# Altium footprint library Dahlia Carrier Board.PcbLib: 99 footprints (part 1 of 7)
Each footprint in its own frame and in the unit in brackets; x right, y up, seen from the top. Pads: shape width x height; smd on the part's side, far side on the other; paste and mask are expansions set on the pad; w line width, h text height; cw(c..) or ccw(c..) is an arc to the next point about the centre after c.
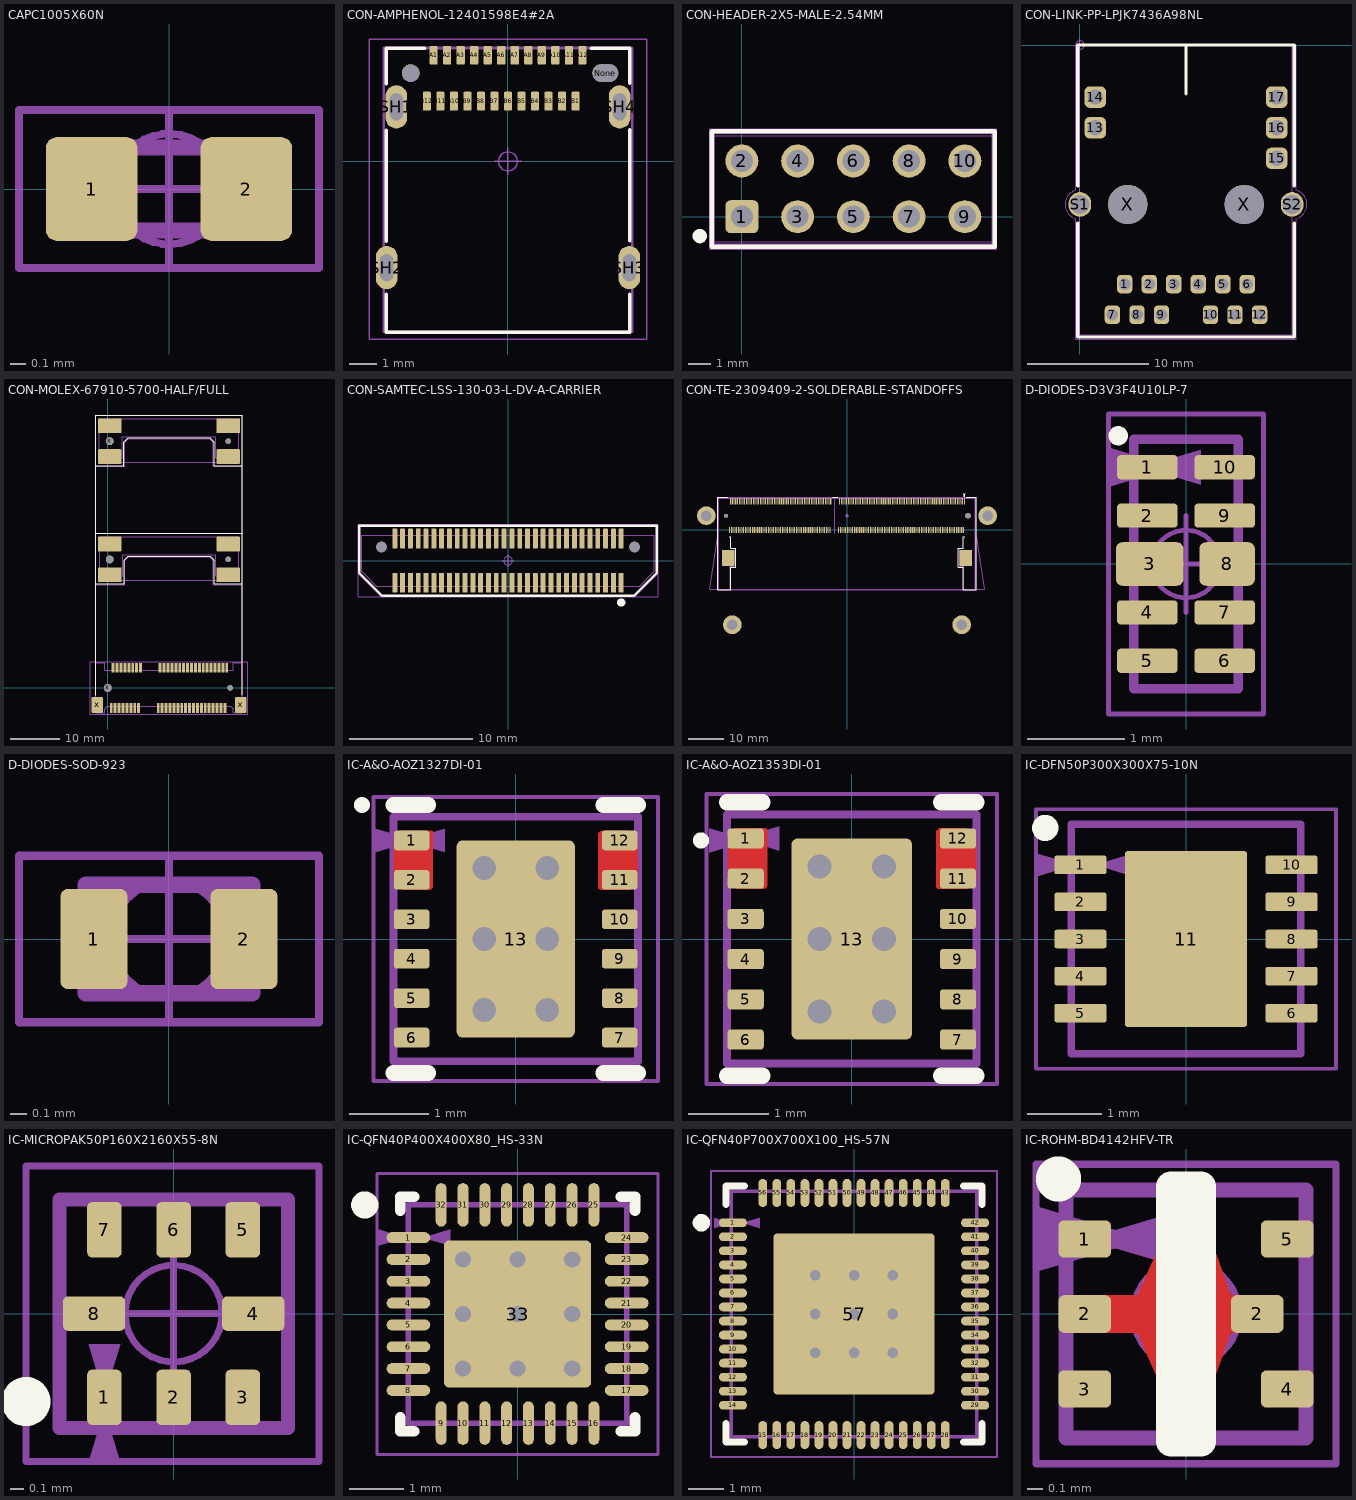
[diagram p0: the footprints below, top view; thin cyan lines are the x and y axes]

## CAPC1005X60N [mm]
pads (2):
  rrect25% 0.58x0.66 smd: 1(-0.49,0) 2(0.49,0)
Top Component Outline:
  lines w0.05: -0.95,-0.5 -0.95,0.5 0.95,0.5 0.95,-0.5 -0.95,-0.5
Top 3D Body:
  lines w0.001: -0.5,-0.25 -0.5,0.25 0.5,0.25 0.5,-0.25 -0.5,-0.25
Top Dimensions:
  lines w0.1: -0.512,-0.262 -0.512,0.262 0.512,0.262 0.512,-0.262 -0.512,-0.262
Top Component Center:
  circle w0.05: c0,0 r0.35
  lines w0.05: -0.5,0 0.5,0 ; 0,-0.5 0,0.5
Top Assembly:
  text ".Designator" at -0.775,-0.3 h0.75
3D body "User Library-CAPC1005X06.step": height 0.6, standoff 0, extent -0.5,-0.25 0.5,0.25

## CON-AMPHENOL-12401598E4#2A [mm] "USB 3.1 Gen 2, Input Output Connectors, USB type C, Receptacle, Top mount, dual-row SMT, 1.6mmPCB"
height 3.28
pads (30):
  rrect30% 0.3x0.7 smd: A1(-2.75,3.93) A2(-2.25,3.93) A3(-1.75,3.93) A4(-1.25,3.93) A5(-0.75,3.93) A6(-0.25,3.93) A7(0.25,3.93) A8(0.75,3.93) A9(1.25,3.93) A10(1.75,3.93) A11(2.25,3.93) A12(2.75,3.93) B1(2.5,2.23) B2(2,2.23) B3(1.5,2.23) B4(1,2.23) B5(0.5,2.23) B6(0,2.23) B7(-0.5,2.23) B8(-1,2.23) B9(-1.5,2.23) B10(-2,2.23) B11(-2.5,2.23) B12(-3,2.23)
  round 0.65 hole 0.65 unplated: None(-3.6,3.27)
  oval 0.95x0.65 hole 0.65 slot 0.95 at 0 deg unplated: None(3.6,3.27)
  oval 0.8x1.6 hole 0.5 slot 1 at 90 deg: SH1(-4.13,2.02) SH2(-4.49,-3.93) SH3(4.49,-3.93) SH4(4.13,2.02)
Top Overlay:
  lines w0.127: -4.5,-4.92 -4.5,-6.32 4.5,-6.32 4.5,-4.91 ; -4.5,-2.95 -4.5,1.15 ; -4.5,2.87 -4.5,4.18 -3.08,4.18 ; 3.08,4.18 4.5,4.18 4.5,2.89 ; 4.5,-2.94 4.5,1.17
Top Component Outline:
  lines w0.05: -5.14,-6.57 -5.14,4.53 5.14,4.53 5.14,-6.57 -5.14,-6.57
Top 3D Body:
  lines w0: -4.74,-4.23 ccw(c-4.49,-4.23) -4.24,-4.23 -4.24,-3.63 ccw(c-4.49,-3.63) -4.74,-3.63 -4.74,-4.23 ; -4.38,1.72 ccw(c-4.13,1.72) -3.88,1.72 -3.88,2.32 ccw(c-4.13,2.32) -4.38,2.32 -4.38,1.72 ; 3.88,1.72 ccw(c4.13,1.72) 4.38,1.72 4.38,2.32 ccw(c4.13,2.32) 3.88,2.32 3.88,1.72 ; 4.24,-4.23 ccw(c4.49,-4.23) 4.74,-4.23 4.74,-3.63 ccw(c4.49,-3.63) 4.24,-3.63 4.24,-4.23
  lines w0.001: -4.6,-6.305 4.6,-6.305 4.6,4.195 -4.6,4.195 -4.6,-6.305
Top Dimensions:
  lines w0.1: -4.6,-6.3 -4.6,4.2 4.575,4.2 4.6,4.175 4.6,-6.3 -4.6,-6.3
Top Component Center:
  circle w0.05: c0,0 r0.35
  lines w0.05: -0.5,0 0.5,0 ; 0,-0.5 0,0.5
Top Assembly:
  text ".Designator" at -0.454,-0.265 h0.75
3D body "12401598E4#2A--3DModel-STEP-56544.STEP": height 3.28, standoff -2.1, extent -4.6,-6.305 4.6,4.195

## CON-HEADER-2X5-MALE-2.54MM [mm] "2.54 mm header"
height 10.8
pads (10):
  rrect30% 1.5x1.5 hole 1: 1(0,0)
  round 1.5 hole 1: 2(0,2.54) 3(2.54,0) 4(2.54,2.54) 5(5.08,0) 6(5.08,2.54) 7(7.62,0) 8(7.62,2.54) 9(10.16,0) 10(10.16,2.54)
Top Overlay:
  circle w0.4: c-1.92,-0.885 r0.125
  lines w0.2: -1.375,-1.375 -1.375,3.9 11.525,3.9 11.525,-1.375 -1.375,-1.375
Top Component Outline:
  lines w0.05: -1.475,-1.475 -1.475,4 11.625,4 11.625,-1.475 -1.475,-1.475
Top 3D Body:
  lines w0.001: -1.27,-1.14 11.43,-1.14 11.43,3.68 -1.27,3.68 -1.27,-1.14
Top Dimensions:
  lines w0.1: -1.27,-1.27 -1.27,3.81 11.43,3.81 11.43,-1.27 -1.27,-1.27
Top Component Center:
  circle w0.05: c0,0 r0.35
  lines w0.05: -0.5,0 0.5,0 ; 0,-0.5 0,0.5
Top Assembly:
  text ".Designator" at 6.77,1.44 h0.75
3D body "Samtec-TSW-105-07-G-D.step": height 8.4, standoff -2.52, extent -1.27,-1.27 11.43,3.81

## CON-LINK-PP-LPJK7436A98NL [mil] "RJ45 Ethernet Connector 10000BaseT"
pads (21):
  rrect50% 50x60 hole 38: 1(146,-779.68) 2(226,-779.68) 3(306,-779.68) 4(386,-779.68) 5(466,-779.68) 6(546,-779.68) 7(106,-879.68) 8(186,-879.68) 9(266,-879.68) 10(426,-879.68) 11(506,-879.68) 12(586,-879.68)
  rrect50% 70x70 hole 50: 13(50,-269.69) 14(50,-169.69) 15(642,-369.69) 16(642,-269.69) 17(642,-169.69)
  oval 74x80 hole 62: S1(0,-519.68) S2(692,-519.68)
  round 128 hole 128 unplated: X(156,-519.68) X(536,-519.68)
Top Overlay:
  lines w10: -6.95,-579.68 -6.95,-951.77 699.02,-951.77 699.02,-579.68 ; -6.95,-459.49 -6.95,0 699.02,0 699.02,-460 ; 346,-159.69 346,-0.06 346.06,0
Top Component Outline:
  lines w1.97: -13.78,-473.23 -13.78,0 705.91,0 705.91,-473.24 ; -13.76,-473.28 ccw(c0.2,-519.71) -13.78,-566.13 -13.78,-958.66 705.91,-958.66 705.91,-566.09 ; 705.89,-566.05 ccw(c691.8,-519.66) 705.89,-473.28
Top 3D Body:
  lines w0.04: 0,-944.88 0,0 692.13,0 692.13,-944.88 0,-944.88
Top Dimensions:
  lines w3.94: 0,-944.88 0,0 692.13,0 692.13,-944.88 0,-944.88
Top Component Center:
  circle w1.97: c0,0 r13.78
  lines w1.97: -19.68,0 19.68,0 ; 0,-19.68 0,19.68
Top Assembly:
  text ".Designator" at -61,25 h29.53
3D body "L829-1J1T-43.STEP": height 493.58, standoff -151.39, extent -54.94,-946.68 747.01,19.67

## CON-MOLEX-67910-5700-HALF/FULL [mm]
height 5.5
pads (68):
  rrect12% 0.6x2 smd: 1(0.7,-4.1) 2(1.1,4.1) 3(1.5,-4.1) 4(1.9,4.1) 5(2.3,-4.1) 6(2.7,4.1) 7(3.1,-4.1) 8(3.5,4.1) 9(3.9,-4.1) 10(4.3,4.1) 11(4.7,-4.1) 12(5.1,4.1) 13(5.5,-4.1) 14(5.9,4.1) 15(6.3,-4.1) 16(6.7,4.1) 17(10.3,-4.1) 18(10.7,4.1) 19(11.1,-4.1) 20(11.5,4.1) 21(11.9,-4.1) 22(12.3,4.1) 23(12.7,-4.1) 24(13.1,4.1) 25(13.5,-4.1) 26(13.9,4.1) 27(14.3,-4.1) 28(14.7,4.1) 29(15.1,-4.1) 30(15.5,4.1) 31(15.9,-4.1) 32(16.3,4.1) 33(16.7,-4.1) 34(17.1,4.1) 35(17.5,-4.1) 36(17.9,4.1) 37(18.3,-4.1) 38(18.7,4.1) 39(19.1,-4.1) 40(19.5,4.1) 41(19.9,-4.1) 42(20.3,4.1) 43(20.7,-4.1) 44(21.1,4.1) 45(21.5,-4.1) 46(21.9,4.1) 47(22.3,-4.1) 48(22.7,4.1) 49(23.1,-4.1) 50(23.5,4.1) 51(23.9,-4.1) 52(24.3,4.1)
  rrect12% 2.3x3.2 smd: x(-2.15,-3.5) x(27.15,-3.5)
  round 1.6 hole 1.6 unplated: x(0,0) x(0.4,50.4) ""(0.4,26.25)
  round 1.1 hole 1.1 unplated: x(24.6,50.4) x(25,0) ""(24.6,26.25)
  rrect12% 4.8x3 smd: ""(0.4,23.1) ""(0.4,29.4) ""(0.4,47.25) ""(0.4,53.55) ""(24.6,23.1) ""(24.6,29.4) ""(24.6,47.25) ""(24.6,53.55)
Top Overlay:
  lines w0.2: -2.5,-1.5 -2.5,55.725 27.5,55.725 27.5,-1.5 ; -2.5,21.264 3.332,21.264 3.332,26.077 4.168,26.914 20.896,26.914 21.732,26.077 21.732,21.264 27.382,21.264 ; -2.468,31.589 27.532,31.589 ; -2.35,45.4 3.3,45.4 3.3,50.214 4.136,51.05 20.864,51.05 21.7,50.214 21.7,45.4 27.35,45.4
Top Component Outline:
  lines w0.05: -2.5,5.334 -2.5,45.25 ; -2.5,21.114 3.482,21.114 3.482,26.024 4.221,26.764 20.836,26.764 21.582,26.018 21.582,21.114 27.5,21.114 ; -2.5,31.591 27.5,31.591 ; 27.5,5.334 27.5,45.25 ; -2.5,45.25 -2.5,55.728 27.5,55.728 27.5,45.25 ; -2.5,45.25 3.45,45.25 3.45,50.161 4.189,50.9 20.804,50.9 21.55,50.154 21.55,45.25 27.5,45.25 ; -3.556,-5.334 28.575,-5.334 28.575,5.334 -3.556,5.334 -3.556,-5.334
Top 3D Body:
  lines w0.001: 0.9,47.05 0.9,46.24 2.5,46.24 2.5,47.05 ; 0.932,22.914 0.932,22.104 2.532,22.104 2.532,22.914 ; 22.5,47.05 22.5,46.24 24.1,46.24 24.1,47.05 ; 22.532,22.914 22.532,22.104 24.132,22.104 24.132,22.914 ; -2.5,5.1 -0.625,5.1 -0.625,3.6 25.625,3.6 25.625,5.1 ; -2.5,5.1 -2.5,5.1 ; -2.5,5.1 -2.5,-5.1 -0.625,-5.1 -0.625,-4.25 -0.125,-3.75 25.125,-3.75 25.625,-4.25 25.625,-5.1 27.5,-5.1 ; -1.725,47.05 3,47.05 3,51.33 22,51.33 22,47.05 26.725,47.05 ; -1.725,47.05 -1.725,55 26.725,55 26.725,47.05 ; -1.725,47.05 -1.725,46.09 26.725,46.09 26.725,47.05 ; -1.693,22.914 -1.693,21.954 26.757,21.954 26.757,22.914 ; -1.693,22.914 -1.693,30.864 26.757,30.864 26.757,22.914 ; -1.693,22.914 3.032,22.914 3.032,27.194 22.032,27.194 22.032,22.914 26.757,22.914 ; 25.625,5.1 27.5,5.1 27.5,-5.1 ; 25.625,5.1 25.625,5.1 ; 27.5,-5.1 27.5,-5.1
Top Dimensions:
  lines w0.1: 0.9,47.05 0.9,46.24 2.5,46.24 2.5,47.05 ; 0.932,22.914 0.932,22.104 2.532,22.104 2.532,22.914 ; 22.5,47.05 22.5,46.24 24.1,46.24 24.1,47.05 ; 22.532,22.914 22.532,22.104 24.132,22.104 24.132,22.914 ; -2.5,5.1 -0.625,5.1 -0.625,3.6 25.625,3.6 25.625,5.1 ; -2.5,5.1 -2.5,-5.1 -0.625,-5.1 -0.625,-4.25 -0.125,-3.75 25.125,-3.75 25.625,-4.25 25.625,-5.1 27.5,-5.1 ; -2.5,5.1 -2.5,5.1 ; 25.625,5.1 27.5,5.1 27.5,-5.1 ; 25.625,5.1 25.625,5.1 ; 27.5,-5.1 27.5,-5.1 ; -1.725,47.05 3,47.05 3,51.33 22,51.33 22,47.05 26.725,47.05 26.725,55 -1.725,55 -1.725,47.05 ; -1.693,22.914 -1.693,30.864 26.757,30.864 26.757,22.914 22.032,22.914 22.032,27.194 3.032,27.194 3.032,22.914 -1.693,22.914
Top Component Center:
  circle w0.05: c0,0 r0.35
  lines w0.05: -0.5,0 0.5,0 ; 0,-0.5 0,0.5
Top Assembly:
  text ".Designator" at -3.099,-5.944 h0.75
3D body "679105700.stp": height 5.77, standoff -0.73, extent -2.5,-5.1 27.5,5.1

## CON-SAMTEC-LSS-130-03-L-DV-A-CARRIER [mm] "0.635 mm Razor Beam High-Speed Hermaphroditic Terminal/Socket Strip"
height 5.49
pads (62):
  rrect20% 0.4x1.6 smd: 1(9.207,-1.8) 2(9.207,1.8) 3(8.572,-1.8) 4(8.572,1.8) 5(7.938,-1.8) 6(7.938,1.8) 7(7.302,-1.8) 8(7.302,1.8) 9(6.667,-1.8) 10(6.667,1.8) 11(6.032,-1.8) 12(6.032,1.8) 13(5.397,-1.8) 14(5.397,1.8) 15(4.763,-1.8) 16(4.763,1.8) 17(4.127,-1.8) 18(4.127,1.8) 19(3.492,-1.8) 20(3.492,1.8) 21(2.857,-1.8) 22(2.857,1.8) 23(2.222,-1.8) 24(2.222,1.8) 25(1.587,-1.8) 26(1.587,1.8) 27(0.953,-1.8) 28(0.953,1.8) 29(0.318,-1.8) 30(0.318,1.8) 31(-0.318,-1.8) 32(-0.318,1.8) 33(-0.953,-1.8) 34(-0.953,1.8) 35(-1.587,-1.8) 36(-1.587,1.8) 37(-2.222,-1.8) 38(-2.222,1.8) 39(-2.857,-1.8) 40(-2.857,1.8) 41(-3.492,-1.8) 42(-3.492,1.8) 43(-4.127,-1.8) 44(-4.127,1.8) 45(-4.763,-1.8) 46(-4.763,1.8) 47(-5.397,-1.8) 48(-5.397,1.8) 49(-6.032,-1.8) 50(-6.032,1.8) 51(-6.667,-1.8) 52(-6.667,1.8) 53(-7.302,-1.8) 54(-7.302,1.8) 55(-7.938,-1.8) 56(-7.938,1.8) 57(-8.572,-1.8) 58(-8.572,1.8) 59(-9.207,-1.8) 60(-9.207,1.8)
  round 0 hole 0.9 unplated mask+0.55: ""(-10.275,1.1) ""(10.275,1.1)
Top Overlay:
  circle w0.5: c9.2,-3.4 r0.088
  lines w0.2: -12.1,-1 -12.1,2.85 12.1,2.85 12.1,-1 10.246,-2.854 -10.246,-2.854 -12.1,-1
Top Component Outline:
  lines w0.05: -12.2,-1.05 -10.313,-2.937 ; 10.313,-2.937 12.2,-1.05 ; -12.2,-2.95 12.2,-2.95 12.2,2.95 -12.2,2.95 -12.2,-2.95
Top 3D Body:
  lines w0.001: -11.9,-0.87 -10.7,-2.07 10.7,-2.07 11.9,-0.87 11.9,2.07 -11.9,2.07 -11.9,-0.87
Top Dimensions:
  lines w0.1: -11.9,-0.87 -10.7,-2.07 10.7,-2.07 11.9,-0.87 11.9,2.07 -11.9,2.07 -11.9,-0.87
Top Component Center:
  circle w0.05: c0,0 r0.35
  lines w0.05: -0.5,0 0.5,0 ; 0,-0.5 0,0.5
Top Assembly:
  text ".Designator" at -1.69,-0.17 h0.75
3D body "LSS-130-03-L-DV-A.stp": height 5.46, standoff -0.84, extent -11.898,-2.3 11.903,2.3

## CON-TE-2309409-2-SOLDERABLE-STANDOFFS [mm]
pads (268):
  rrect40% 0.3x1.75 smd: 1(33.375,8.05) 2(33.125,-0.15) 3(32.875,8.05) 4(32.625,-0.15) 5(32.375,8.05) 6(32.125,-0.15) 7(31.875,8.05) 8(31.625,-0.15) 9(31.375,8.05) 10(31.125,-0.15) 11(30.875,8.05) 12(30.625,-0.15) 13(30.375,8.05) 14(30.125,-0.15) 15(29.875,8.05) 16(29.625,-0.15) 17(29.375,8.05) 18(29.125,-0.15) 19(28.875,8.05) 20(28.625,-0.15) 21(28.375,8.05) 22(28.125,-0.15) 23(27.875,8.05) 24(27.625,-0.15) 25(27.375,8.05) 26(27.125,-0.15) 27(26.875,8.05) 28(26.625,-0.15) 29(26.375,8.05) 30(26.125,-0.15) 31(25.875,8.05) 32(25.625,-0.15) 33(25.375,8.05) 34(25.125,-0.15) 35(24.875,8.05) 36(24.625,-0.15) 37(24.375,8.05) 38(24.125,-0.15) 39(23.875,8.05) 40(23.625,-0.15) 41(23.375,8.05) 42(23.125,-0.15) 43(22.875,8.05) 44(22.625,-0.15) 45(22.375,8.05) 46(22.125,-0.15) 47(21.875,8.05) 48(21.625,-0.15) 49(21.375,8.05) 50(21.125,-0.15) 51(20.875,8.05) 52(20.625,-0.15) 53(20.375,8.05) 54(20.125,-0.15) 55(19.875,8.05) 56(19.625,-0.15) 57(19.375,8.05) 58(19.125,-0.15) 59(18.875,8.05) 60(18.625,-0.15) 61(18.375,8.05) 62(18.125,-0.15) 63(17.875,8.05) 64(17.625,-0.15) 65(17.375,8.05) 66(17.125,-0.15) 67(16.875,8.05) 68(16.625,-0.15) 69(16.375,8.05) 70(16.125,-0.15) 71(15.875,8.05) 72(15.625,-0.15) 73(15.375,8.05) 74(15.125,-0.15) 75(14.875,8.05) 76(14.625,-0.15) 77(14.375,8.05) 78(14.125,-0.15) 79(13.875,8.05) 80(13.625,-0.15) 81(13.375,8.05) 82(13.125,-0.15) 83(12.875,8.05) 84(12.625,-0.15) 85(12.375,8.05) 86(12.125,-0.15) 87(11.875,8.05) 88(11.625,-0.15) 89(11.375,8.05) 90(11.125,-0.15) 91(10.875,8.05) 92(10.625,-0.15) 93(10.375,8.05) 94(10.125,-0.15) 95(9.875,8.05) 96(9.625,-0.15) 97(9.375,8.05) 98(9.125,-0.15) 99(8.875,8.05) 100(8.625,-0.15) 101(8.375,8.05) 102(8.125,-0.15) 103(7.875,8.05) 104(7.625,-0.15) 105(7.375,8.05) 106(7.125,-0.15) 107(6.875,8.05) 108(6.625,-0.15) 109(6.375,8.05) 110(6.125,-0.15) 111(5.875,8.05) 112(5.625,-0.15) 113(5.375,8.05) 114(5.125,-0.15) 115(4.875,8.05) 116(4.625,-0.15) 117(4.375,8.05) 118(4.125,-0.15) 119(3.875,8.05) 120(3.625,-0.15) 121(3.375,8.05) 122(3.125,-0.15) 123(2.875,8.05) 124(2.625,-0.15) 125(2.375,8.05) 126(2.125,-0.15) 127(1.875,8.05) 128(1.625,-0.15) 129(1.375,8.05) 130(1.125,-0.15) 131(0.875,8.05) 132(0.625,-0.15) 133(0.375,8.05) 134(0.125,-0.15) 135(-0.125,8.05) 136(-0.375,-0.15) 137(-0.625,8.05) 138(-0.875,-0.15) 139(-1.125,8.05) 140(-1.375,-0.15) 141(-1.625,8.05) 142(-1.875,-0.15) 143(-2.125,8.05) 144(-2.375,-0.15) 145(-4.625,8.05) 146(-4.875,-0.15) 147(-5.125,8.05) 148(-5.375,-0.15) 149(-5.625,8.05) 150(-5.875,-0.15) 151(-6.125,8.05) 152(-6.375,-0.15) 153(-6.625,8.05) 154(-6.875,-0.15) 155(-7.125,8.05) 156(-7.375,-0.15) 157(-7.625,8.05) 158(-7.875,-0.15) 159(-8.125,8.05) 160(-8.375,-0.15) 161(-8.625,8.05) 162(-8.875,-0.15) 163(-9.125,8.05) 164(-9.375,-0.15) 165(-9.625,8.05) 166(-9.875,-0.15) 167(-10.125,8.05) 168(-10.375,-0.15) 169(-10.625,8.05) 170(-10.875,-0.15) 171(-11.125,8.05) 172(-11.375,-0.15) 173(-11.625,8.05) 174(-11.875,-0.15) 175(-12.125,8.05) 176(-12.375,-0.15) 177(-12.625,8.05) 178(-12.875,-0.15) 179(-13.125,8.05) 180(-13.375,-0.15) 181(-13.625,8.05) 182(-13.875,-0.15) 183(-14.125,8.05) 184(-14.375,-0.15) 185(-14.625,8.05) 186(-14.875,-0.15) 187(-15.125,8.05) 188(-15.375,-0.15) 189(-15.625,8.05) 190(-15.875,-0.15) 191(-16.125,8.05) 192(-16.375,-0.15) 193(-16.625,8.05) 194(-16.875,-0.15) 195(-17.125,8.05) 196(-17.375,-0.15) 197(-17.625,8.05) 198(-17.875,-0.15) 199(-18.125,8.05) 200(-18.375,-0.15) 201(-18.625,8.05) 202(-18.875,-0.15) 203(-19.125,8.05) 204(-19.375,-0.15) 205(-19.625,8.05) 206(-19.875,-0.15) 207(-20.125,8.05) 208(-20.375,-0.15) 209(-20.625,8.05) 210(-20.875,-0.15) 211(-21.125,8.05) 212(-21.375,-0.15) 213(-21.625,8.05) 214(-21.875,-0.15) 215(-22.125,8.05) 216(-22.375,-0.15) 217(-22.625,8.05) 218(-22.875,-0.15) 219(-23.125,8.05) 220(-23.375,-0.15) 221(-23.625,8.05) 222(-23.875,-0.15) 223(-24.125,8.05) 224(-24.375,-0.15) 225(-24.625,8.05) 226(-24.875,-0.15) 227(-25.125,8.05) 228(-25.375,-0.15) 229(-25.625,8.05) 230(-25.875,-0.15) 231(-26.125,8.05) 232(-26.375,-0.15) 233(-26.625,8.05) 234(-26.875,-0.15) 235(-27.125,8.05) 236(-27.375,-0.15) 237(-27.625,8.05) 238(-27.875,-0.15) 239(-28.125,8.05) 240(-28.375,-0.15) 241(-28.625,8.05) 242(-28.875,-0.15) 243(-29.125,8.05) 244(-29.375,-0.15) 245(-29.625,8.05) 246(-29.875,-0.15) 247(-30.125,8.05) 248(-30.375,-0.15) 249(-30.625,8.05) 250(-30.875,-0.15) 251(-31.125,8.05) 252(-31.375,-0.15) 253(-31.625,8.05) 254(-31.875,-0.15) 255(-32.125,8.05) 256(-32.375,-0.15) 257(-32.625,8.05) 258(-32.875,-0.15) 259(-33.125,8.05) 260(-33.375,-0.15)
  round 5.3 / inner round 0 / far side round 0 hole 3 unplated: ""(-40,3.95) ""(-32.6,-27.05) ""(32.6,-27.05) ""(40,3.95)
  round 1.1 hole 1.1 unplated: ""(-34.4,3.95)
  rrect10% 3.5x4.6 smd: ""(-33.8,-8.05) ""(33.8,-8.05)
  round 1.6 hole 1.6 unplated: ""(34.4,3.95)
Top Overlay:
  rectangle: 33.197,9.598 33.553,10.15
  lines w0.2: -33.9,9.15 -36.7,9.15 -36.7,-17.15 -33,-17.15 -33,-10.75 -31.7,-10.75 -31.7,-5.35 -33,-5.35 -33,-2.05 -33.5,-2.05 ; -4.1,9.15 -2.7,9.15 ; 33.5,-2.05 33,-2.05 33,-5.35 31.7,-5.35 31.7,-10.75 33,-10.75 33,-17.15 36.7,-17.15 36.7,9.15 33.9,9.15 ; 33.075,10.15 33.375,9.35 33.675,10.15 33.075,10.15
Top Paste:
  drawing of 16 lines, arcs and shapes, not listed
Top Component Outline:
  lines w0.05: -36.7,-17.15 -36.7,9.15 36.7,9.15 36.7,-17.15 -36.7,-17.15
Top 3D Body:
  lines w0.001: -3.5,-1.13 -3.5,8.95 ; 36.5,-16.9 36.5,8.95 -36.5,8.95 -36.5,-2.05 -36.7,-2.05 -39,-16.9 39,-16.9 36.7,-2.05 36.5,-2.05
Top Dimensions:
  circle w0.1: c34.4,3.95 r0.381
  lines w0.1: -32.05,-5.75 -32.05,-10.35 -33.23,-10.35 -33.23,-16.9 -36.5,-16.9 -36.5,8.95 36.5,8.95 36.5,-16.9 33.23,-16.9 33.23,-10.35 32.05,-10.35 32.05,-5.75 ; 33.765,3.95 35.035,3.95 ; 34.4,3.315 34.4,4.585
Top Component Center:
  circle w0.05: c0,3.95 r0.35
  lines w0.05: -0.5,3.95 0.5,3.95 ; 0,3.45 0,4.45
Top Assembly:
  text ".Designator" at 33.409,9.436 h0.75
3D body "c-2309409-2-1-3d.stp": height 5.27, standoff -0.28, extent -36.5,-16.9 36.5,8.95

## D-DIODES-D3V3F4U10LP-7 [mm] "U-DFN2510-10 , 10-Leads, Body 1.01x2.51mm, Pitch 0.50mm, IPC Medium Density"
height 0.61
pads (10):
  rrect30% 0.625x0.25 smd: 1(-0.4,1) 2(-0.4,0.5) 4(-0.4,-0.5) 5(-0.4,-1) 6(0.4,-1) 7(0.4,-0.5) 9(0.4,0.5) 10(0.4,1)
  rrect30% 0.7x0.45 smd: 3(-0.375,0)
  rrect30% 0.575x0.45 smd: 8(0.425,0)
Top Overlay:
  circle w0.1: c-0.7,1.325 r0.05
Top Component Outline:
  region: -0.775,0.805 -0.125,1 -0.775,1.195
  lines w0.05: -0.8,-1.55 -0.8,1.55 0.8,1.55 0.8,-1.55 -0.8,-1.55
Top 3D Body:
  lines w0.001: -0.54,-1.29 0.54,-1.29 0.54,1.29 -0.54,1.29 -0.54,-1.29
Top Dimensions:
  region: 0.15,1.18 -0.45,1 0.15,0.82
  lines w0.1: -0.54,-1.29 -0.54,1.29 0.54,1.29 0.54,-1.29 -0.54,-1.29
Top Component Center:
  circle w0.05: c0,0 r0.35
  lines w0.05: -0.5,0 0.5,0 ; 0,-0.5 0,0.5
Top Assembly:
  text ".Designator" at -0.175,0.425 h0.75
3D body "D-Diodes-D3V3F4U10LP-7.step": height 0.61, standoff 0, extent -0.54,-1.29 0.54,1.29

## D-DIODES-SOD-923 [mm] "SOD-923, 2-Leads, Body 0.60x1.00mm, IPC Medium Density"
height 0.4
pads (2):
  rrect20% 0.4x0.6 smd: 1(-0.45,0) 2(0.45,0)
Top Component Outline:
  lines w0.05: -0.9,-0.5 0.9,-0.5 0.9,0.5 -0.9,0.5 -0.9,-0.5
Top 3D Body:
  lines w0.001: -0.5,-0.325 -0.5,0.325 0.5,0.325 0.5,-0.325 -0.5,-0.325
Top Dimensions:
  lines w0.1: -0.5,-0.325 -0.5,0.325 0.5,0.325 0.5,-0.325 -0.5,-0.325
Top Component Center:
  circle w0.05: c0,0 r0.35
  lines w0.05: -0.5,0 0.5,0 ; 0,-0.5 0,0.5
Top Assembly:
  text ".Designator" at -1.352,-0.136 h0.6
3D body "SODFL100X40-2N.step": height 0.4, standoff 0, extent -0.5,-0.325 0.5,0.325

## IC-A&O-AOZ1327DI-01 [mm] "PSON, 12-Leads, Body 3.00x3.00mm, Pitch 0.50mm, Thermal Pad 2.50x1.50mm, IPC Medium Density"
height 1
pads (13):
  rrect30% 0.45x0.25 smd: 1(-1.32,1.25) 2(-1.32,0.75) 3(-1.32,0.25) 4(-1.32,-0.25) 5(-1.32,-0.75) 6(-1.32,-1.25) 7(1.32,-1.25) 8(1.32,-0.75) 9(1.32,-0.25) 10(1.32,0.25) 11(1.32,0.75) 12(1.32,1.25)
  rrect10% 1.5x2.5 smd paste-0.75: 13(0,0)
via 0.4,-0.9 diameter 0.6 hole 0.3
via -0.4,-0.9 diameter 0.6 hole 0.3
via 0.4,0 diameter 0.6 hole 0.3
via -0.4,0 diameter 0.6 hole 0.3
via 0.4,0.9 diameter 0.6 hole 0.3
via -0.4,0.9 diameter 0.6 hole 0.3
Top Layer:
  region: 1.075,0.625 1.07,0.625 1.061,0.629 1.054,0.636 1.05,0.645 1.05,0.65 1.05,1.325 1.05,1.335 1.058,1.353 1.072,1.367 1.09,1.375 1.1,1.375 1.425,1.375 1.545,1.255 1.545,0.72 1.45,0.625
  region: -1.075,1.375 -1.07,1.375 -1.061,1.371 -1.054,1.364 -1.05,1.355 -1.05,1.35 -1.05,0.675 -1.05,0.665 -1.058,0.647 -1.072,0.633 -1.09,0.625 -1.1,0.625 -1.425,0.625 -1.545,0.745 -1.545,1.28 -1.45,1.375
Top Overlay:
  circle w0.1: c-1.95,1.7 r0.05
  lines w0.2: -1.55,-1.7 -1.11,-1.7 ; -1.55,1.7 -1.11,1.7 ; 1.11,-1.7 1.55,-1.7 ; 1.11,1.7 1.55,1.7
Top Paste:
  region: 0.11,0.075 0.126,0.122 0.18,0.204 0.258,0.264 0.351,0.296 0.4,0.3 0.55,0.3 0.55,0.6 0.4,0.6 0.341,0.606 0.233,0.651 0.151,0.733 0.106,0.841 0.1,0.9 0.1,1.05 -0.1,1.05 -0.1,0.9 -0.106,0.841 -0.151,0.733 -0.233,0.651 -0.341,0.606 -0.4,0.6 -0.55,0.6 -0.55,0.3 -0.4,0.3 -0.351,0.296 -0.258,0.264 -0.18,0.204 -0.126,0.122 -0.11,0.075
  region: -0.11,-0.075 -0.126,-0.122 -0.18,-0.204 -0.258,-0.264 -0.351,-0.296 -0.4,-0.3 -0.55,-0.3 -0.55,-0.6 -0.4,-0.6 -0.341,-0.606 -0.233,-0.651 -0.151,-0.733 -0.106,-0.841 -0.1,-0.9 -0.1,-1.05 0.1,-1.05 0.1,-0.9 0.106,-0.841 0.151,-0.733 0.233,-0.651 0.341,-0.606 0.4,-0.6 0.55,-0.6 0.55,-0.3 0.4,-0.3 0.351,-0.296 0.258,-0.264 0.18,-0.204 0.126,-0.122 0.11,-0.075
Top Solder:
  region: -1.55,1.175 -1.55,0.85 -1.05,0.85 -1.05,1.175
  region: 1.05,1.15 1.05,0.825 1.55,0.825 1.55,1.15
Top Component Outline:
  region: -1.775,1.1 -1.275,1.25 -1.775,1.4
  lines w0.05: -1.805,-1.8 1.805,-1.8 1.805,1.8 -1.805,1.8 -1.805,-1.8
Top 3D Body:
  lines w0.001: -1.551,-1.55 1.551,-1.55 1.551,1.55 -1.551,1.55 -1.551,-1.55
Top Dimensions:
  region: -0.9,1.4 -1.4,1.25 -0.9,1.1
  lines w0.1: -1.55,-1.55 -1.55,1.55 1.55,1.55 1.55,-1.55 -1.55,-1.55
Top Component Center:
  circle w0.05: c0,0 r0.35
  lines w0.05: -0.5,0 0.5,0 ; 0,-0.5 0,0.5
Top Assembly:
  text ".Designator" at -0.5,-0.2 h0.75
3D body "PSON50P300X100_HS-13N.step": height 1, standoff 0, extent -1.551,-1.55 1.551,1.55

## IC-A&O-AOZ1353DI-01 [mm] "PSON, 12-Leads, Body 3.00x3.00mm, Pitch 0.50mm, Thermal Pad 2.50x1.50mm, IPC Medium Density"
height 1
pads (13):
  rrect30% 0.45x0.25 smd: 1(-1.32,1.25) 2(-1.32,0.75) 3(-1.32,0.25) 4(-1.32,-0.25) 5(-1.32,-0.75) 6(-1.32,-1.25) 7(1.32,-1.25) 8(1.32,-0.75) 9(1.32,-0.25) 10(1.32,0.25) 11(1.32,0.75) 12(1.32,1.25)
  rrect10% 1.5x2.5 smd paste-0.75: 13(0,0)
via 0.4,-0.9 diameter 0.6 hole 0.3
via -0.4,-0.9 diameter 0.6 hole 0.3
via 0.4,0 diameter 0.6 hole 0.3
via -0.4,0 diameter 0.6 hole 0.3
via 0.4,0.9 diameter 0.6 hole 0.3
via -0.4,0.9 diameter 0.6 hole 0.3
Top Layer:
  region: 1.075,0.625 1.07,0.625 1.061,0.629 1.054,0.636 1.05,0.645 1.05,0.65 1.05,1.325 1.05,1.335 1.058,1.353 1.072,1.367 1.09,1.375 1.1,1.375 1.425,1.375 1.545,1.255 1.545,0.72 1.45,0.625
  region: -1.075,1.375 -1.07,1.375 -1.061,1.371 -1.054,1.364 -1.05,1.355 -1.05,1.35 -1.05,0.675 -1.05,0.665 -1.058,0.647 -1.072,0.633 -1.09,0.625 -1.1,0.625 -1.425,0.625 -1.545,0.745 -1.545,1.28 -1.45,1.375
Top Overlay:
  circle w0.1: c-1.875,1.225 r0.05
  lines w0.2: -1.55,-1.7 -1.11,-1.7 ; -1.55,1.7 -1.11,1.7 ; 1.11,-1.7 1.55,-1.7 ; 1.11,1.7 1.55,1.7
Top Paste:
  region: 0.11,0.075 0.126,0.122 0.18,0.204 0.258,0.264 0.351,0.296 0.4,0.3 0.55,0.3 0.55,0.6 0.4,0.6 0.341,0.606 0.233,0.651 0.151,0.733 0.106,0.841 0.1,0.9 0.1,1.05 -0.1,1.05 -0.1,0.9 -0.106,0.841 -0.151,0.733 -0.233,0.651 -0.341,0.606 -0.4,0.6 -0.55,0.6 -0.55,0.3 -0.4,0.3 -0.351,0.296 -0.258,0.264 -0.18,0.204 -0.126,0.122 -0.11,0.075
  region: -0.11,-0.075 -0.126,-0.122 -0.18,-0.204 -0.258,-0.264 -0.351,-0.296 -0.4,-0.3 -0.55,-0.3 -0.55,-0.6 -0.4,-0.6 -0.341,-0.606 -0.233,-0.651 -0.151,-0.733 -0.106,-0.841 -0.1,-0.9 -0.1,-1.05 0.1,-1.05 0.1,-0.9 0.106,-0.841 0.151,-0.733 0.233,-0.651 0.341,-0.606 0.4,-0.6 0.55,-0.6 0.55,-0.3 0.4,-0.3 0.351,-0.296 0.258,-0.264 0.18,-0.204 0.126,-0.122 0.11,-0.075
Top Solder:
  region: 1.05,1.175 1.05,0.85 1.55,0.85 1.55,1.175
  region: -1.55,1.175 -1.55,0.85 -1.05,0.85 -1.05,1.175
Top Component Outline:
  region: -1.775,1.075 -1.275,1.225 -1.775,1.375
  lines w0.05: -1.805,-1.8 -1.805,1.8 1.805,1.8 1.805,-1.8 -1.805,-1.8
Top 3D Body:
  lines w0.001: -1.551,-1.55 -1.551,1.55 1.551,1.55 1.551,-1.55 -1.551,-1.55
Top Dimensions:
  region: -0.9,1.4 -1.4,1.25 -0.9,1.1
  lines w0.1: -1.55,-1.55 -1.55,1.55 1.55,1.55 1.55,-1.55 -1.55,-1.55
Top Component Center:
  circle w0.05: c0,0 r0.35
  lines w0.05: -0.5,0 0.5,0 ; 0,-0.5 0,0.5
Top Assembly:
  text ".Designator" at -0.5,-0.2 h0.75
3D body "PSON50P300X100_HS-13N.step": height 1, standoff 0, extent -1.551,-1.55 1.551,1.55

## IC-DFN50P300X300X75-10N [mm]
height 5.5
pads (11):
  rrect20% 0.7x0.25 smd: 1(-1.425,1) 2(-1.425,0.5) 3(-1.425,0) 4(-1.425,-0.5) 5(-1.425,-1) 6(1.425,-1) 7(1.425,-0.5) 8(1.425,0) 9(1.425,0.5) 10(1.425,1)
  rrect5% 1.65x2.38 smd: 11(0,0)
Top Overlay:
  circle w0.254: c-1.9,1.5 r0.05
Top Component Outline:
  region: -2,0.85 -1.5,1 -2,1.15
  lines w0.05: -2.025,-1.75 2.025,-1.75 2.025,1.75 -2.025,1.75 -2.025,-1.75
Top 3D Body:
  lines w0.001: -1.551,-1.55 1.551,-1.55 1.551,1.55 -1.551,1.55 -1.551,-1.55
Top Dimensions:
  region: -0.725,1.15 -1.225,1 -0.725,0.85
  lines w0.1: -1.55,-1.55 1.55,-1.55 1.55,1.55 -1.55,1.55 -1.55,-1.55
Top Component Center:
  circle w0.05: c0,0 r0.35
  lines w0.05: -0.5,0 0.5,0 ; 0,-0.5 0,0.5
Top Assembly:
  text ".Designator" at -1.5,2 h0.75
3D body "Test-2.step": height 0.85, standoff 0, extent -1.551,-1.55 1.551,1.55

## IC-MICROPAK50P160X2160X55-8N [mm]
height 5.5
pads (8):
  rrect30% 0.25x0.4 smd: 1(-0.5,-0.605) 2(0,-0.605) 3(0.5,-0.605) 5(0.5,0.605) 6(0,0.605) 7(-0.5,0.605)
  rrect30% 0.45x0.25 smd: 4(0.575,0) 8(-0.575,0)
Top Overlay:
  circle w0.254: c-1.067,-0.635 r0.05
Top Component Outline:
  region: -0.387,-1.073 -0.5,-0.695 -0.613,-1.073
  lines w0.05: -1.067,-1.067 -1.067,1.067 1.05,1.067 1.05,-1.067 -1.067,-1.067
Top 3D Body:
  lines w0.001: -0.825,-0.825 -0.825,0.825 0.825,0.825 0.825,-0.825 -0.825,-0.825
Top Dimensions:
  region: -0.613,-0.222 -0.5,-0.6 -0.387,-0.222
  lines w0.1: -0.825,-0.825 -0.825,0.825 0.825,0.825 0.825,-0.825 -0.825,-0.825
Top Component Center:
  circle w0.05: c0,0 r0.35
  lines w0.05: -0.5,0 0.5,0 ; 0,-0.5 0,0.5
Top Assembly:
  text ".Designator" at -0.675,-0.3 h0.75
3D body "PQFN50P160X160X55_HS-9N.step": height 0.55, standoff 0, extent -0.825,-0.825 0.825,0.825

## IC-QFN40P400X400X80_HS-33N [mm]
pads (33):
  oval 0.8x0.2 smd: 1(-2,1.4) 2(-2,1) 3(-2,0.6) 4(-2,0.2) 5(-2,-0.2) 6(-2,-0.6) 7(-2,-1) 8(-2,-1.4) 17(2,-1.4) 18(2,-1) 19(2,-0.6) 20(2,-0.2) 21(2,0.2) 22(2,0.6) 23(2,1) 24(2,1.4)
  oval 0.2x0.8 smd: 9(-1.4,-2) 10(-1,-2) 11(-0.6,-2) 12(-0.2,-2) 13(0.2,-2) 14(0.6,-2) 15(1,-2) 16(1.4,-2) 25(1.4,2) 26(1,2) 27(0.6,2) 28(0.2,2) 29(-0.2,2) 30(-0.6,2) 31(-1,2) 32(-1.4,2)
  rrect7% 2.7x2.7 smd paste-5: 33(0,0)
via -1,0 diameter 0.6 hole 0.3
via 0,0 diameter 0.6 hole 0.3
via 1,0 diameter 0.6 hole 0.3
via -1,-1 diameter 0.6 hole 0.3
via 0,-1 diameter 0.6 hole 0.3
via 0,1 diameter 0.6 hole 0.3
via -1,1 diameter 0.6 hole 0.3
via 1,1 diameter 0.6 hole 0.3
via 1,-1 diameter 0.6 hole 0.3
Top Overlay:
  circle w0.25: c-2.8,2 r0.125
  lines w0.2: -2.15,-1.9 -2.15,-2.15 -1.9,-2.15 ; -2.15,1.9 -2.15,2.15 -1.9,2.15 ; 1.9,-2.15 2.15,-2.15 2.15,-1.9 ; 1.9,2.15 2.15,2.15 2.15,1.9
Top Paste:
  region: 0.7,1 0.706,0.941 0.751,0.833 0.833,0.751 0.941,0.706 1,0.7 1.25,0.7 1.25,0.3 1,0.3 0.961,0.297 0.885,0.277 0.817,0.238 0.762,0.183 0.74,0.15 0.26,0.15 0.249,0.167 0.226,0.198 0.198,0.226 0.167,0.249 0.15,0.26 0.15,0.74 0.183,0.762 0.238,0.817 0.277,0.885 0.297,0.961 0.3,1 0.3,1.25 0.7,1.25
  region: 1,-0.7 0.941,-0.706 0.833,-0.751 0.751,-0.833 0.706,-0.941 0.7,-1 0.7,-1.25 0.3,-1.25 0.3,-1 0.297,-0.961 0.277,-0.885 0.238,-0.817 0.183,-0.762 0.15,-0.74 0.15,-0.26 0.167,-0.249 0.198,-0.226 0.226,-0.198 0.249,-0.167 0.26,-0.15 0.74,-0.15 0.762,-0.183 0.817,-0.238 0.885,-0.277 0.961,-0.297 1,-0.3 1.25,-0.3 1.25,-0.7
  region: -0.7,-1 -0.706,-0.941 -0.751,-0.833 -0.833,-0.751 -0.941,-0.706 -1,-0.7 -1.25,-0.7 -1.25,-0.3 -1,-0.3 -0.961,-0.297 -0.885,-0.277 -0.817,-0.238 -0.762,-0.183 -0.74,-0.15 -0.26,-0.15 -0.249,-0.167 -0.226,-0.198 -0.198,-0.226 -0.167,-0.249 -0.15,-0.26 -0.15,-0.74 -0.183,-0.762 -0.238,-0.817 -0.277,-0.885 -0.297,-0.961 -0.3,-1 -0.3,-1.25 -0.7,-1.25
  region: -1,0.7 -0.941,0.706 -0.833,0.751 -0.751,0.833 -0.706,0.941 -0.7,1 -0.7,1.25 -0.3,1.25 -0.3,1 -0.297,0.961 -0.277,0.885 -0.238,0.817 -0.183,0.762 -0.15,0.74 -0.15,0.26 -0.167,0.249 -0.198,0.226 -0.226,0.198 -0.249,0.167 -0.26,0.15 -0.74,0.15 -0.762,0.183 -0.817,0.238 -0.885,0.277 -0.961,0.297 -1,0.3 -1.25,0.3 -1.25,0.7
Top Component Outline:
  region: -2.55,1.25 -2.05,1.4 -2.55,1.55
  lines w0.05: -2.575,-2.575 -2.575,2.575 2.575,2.575 2.575,-2.575 -2.575,-2.575
  lines w0.1: -0.5,0 0.5,0 ; 0,-0.5 0,0.5
Top 3D Body:
  lines w0.001: -2,-2 -2,2 2,2 2,-2 -2,-2
Top Dimensions:
  region: -1.235,1.55 -1.735,1.4 -1.235,1.25
  lines w0.1: -2,-2 -2,2 2,2 2,-2 -2,-2
Top Component Center:
  circle w0.05: c0,0 r0.35
  lines w0.05: -0.5,0 0.5,0 ; 0,-0.5 0,0.5
Top Assembly:
  text ".Designator" at 0.625,0.225 h0.75
3D body "QFN40P400X400X80_HS-33N.step": height 0.8, standoff 0, extent -2.05,-2.05 2.05,2.05

## IC-QFN40P700X700X100_HS-57N [mm]
pads (57):
  oval 0.8x0.25 smd: 1(-3.45,2.6) 2(-3.45,2.2) 3(-3.45,1.8) 4(-3.45,1.4) 5(-3.45,1) 6(-3.45,0.6) 7(-3.45,0.2) 8(-3.45,-0.2) 9(-3.45,-0.6) 10(-3.45,-1) 11(-3.45,-1.4) 12(-3.45,-1.8) 13(-3.45,-2.2) 14(-3.45,-2.6) 29(3.45,-2.6) 30(3.45,-2.2) 31(3.45,-1.8) 32(3.45,-1.4) 33(3.45,-1) 34(3.45,-0.6) 35(3.45,-0.2) 36(3.45,0.2) 37(3.45,0.6) 38(3.45,1) 39(3.45,1.4) 40(3.45,1.8) 41(3.45,2.2) 42(3.45,2.6)
  oval 0.25x0.8 smd: 15(-2.6,-3.45) 16(-2.2,-3.45) 17(-1.8,-3.45) 18(-1.4,-3.45) 19(-1,-3.45) 20(-0.6,-3.45) 21(-0.2,-3.45) 22(0.2,-3.45) 23(0.6,-3.45) 24(1,-3.45) 25(1.4,-3.45) 26(1.8,-3.45) 27(2.2,-3.45) 28(2.6,-3.45) 43(2.6,3.45) 44(2.2,3.45) 45(1.8,3.45) 46(1.4,3.45) 47(1,3.45) 48(0.6,3.45) 49(0.2,3.45) 50(-0.2,3.45) 51(-0.6,3.45) 52(-1,3.45) 53(-1.4,3.45) 54(-1.8,3.45) 55(-2.2,3.45) 56(-2.6,3.45)
  rrect5% 4.6x4.6 smd paste-10: 57(0,0)
via 1.1,-1.1 diameter 0.6 hole 0.3
via 0,-1.1 diameter 0.6 hole 0.3
via -1.1,-1.1 diameter 0.6 hole 0.3
via 1.1,0 diameter 0.6 hole 0.3
via 0,0 diameter 0.6 hole 0.3
via -1.1,0 diameter 0.6 hole 0.3
via 1.1,1.1 diameter 0.6 hole 0.3
via 0,1.1 diameter 0.6 hole 0.3
via -1.1,1.1 diameter 0.6 hole 0.3
Top Overlay:
  circle w0.25: c-4.35,2.6 r0.125
  lines w0.2: -3.65,-3.125 -3.65,-3.65 -3.125,-3.65 ; -3.65,3.125 -3.65,3.65 -3.125,3.65 ; 3.125,-3.65 3.65,-3.65 3.65,-3.125 ; 3.125,3.65 3.65,3.65 3.65,3.125
Top Paste:
  drawing of 16 lines, arcs and shapes, not listed
Top Component Outline:
  region: -3.99,2.45 -3.49,2.6 -3.99,2.75
  lines w0.05: -4.075,-4.075 -4.075,4.075 4.075,4.075 4.075,-4.075 -4.075,-4.075
Top 3D Body:
  lines w0.001: -3.5,-3.5 -3.5,3.5 3.5,3.5 3.5,-3.5 -3.5,-3.5
Top Dimensions:
  region: -2.685,2.75 -3.185,2.6 -2.685,2.45
  lines w0.1: -3.5,-3.5 -3.5,3.5 3.5,3.5 3.5,-3.5 -3.5,-3.5
Top Component Center:
  circle w0.05: c0,0 r0.35
  lines w0.05: -0.5,0 0.5,0 ; 0,-0.5 0,0.5
Top Assembly:
  text ".Designator" at 0.475,0.25 h0.75
3D body "test-5.step": height 1, standoff 0, extent -3.501,-3.501 3.501,3.501

## IC-ROHM-BD4142HFV-TR [mm] "SOTFL, 5-Leads, Body 1.60x1.60mm, Pitch 0.50mm, IPC Medium Density"
height 0.6
pads (6):
  rrect30% 0.35x0.25 smd: 1(-0.675,0.5) 3(-0.675,-0.5) 4(0.675,-0.5) 5(0.675,0.5)
  rrect30% 0.35x0.251 smd: 2(-0.675,0) 2(0.475,0)
Top Layer:
  region: -0.55,0.125 -0.325,0.125 -0.2,0.4 0.2,0.4 0.3,0.125 0.475,0.125 0.475,-0.125 0.3,-0.125 0.2,-0.4 -0.2,-0.4 -0.325,-0.125 -0.55,-0.125
Top Overlay:
  circle w0.25: c-0.85,0.9 r0.025
  lines w0.2: -0.1,-0.85 0.1,-0.85 0.1,0.85 -0.1,0.85 -0.1,-0.85
Top Component Outline:
  region: -0.975,0.287 -0.265,0.5 -0.975,0.713
  lines w0.05: -1,-1 1,-1 1,1 -1,1 -1,-1
Top 3D Body:
  lines w0.001: -0.8,-0.823 0.8,-0.823 0.8,0.823 -0.8,0.823 -0.8,-0.823
Top Dimensions:
  region: 0.035,0.713 -0.675,0.5 0.035,0.287
  lines w0.1: -0.8,-0.825 0.8,-0.825 0.8,0.825 -0.8,0.825 -0.8,-0.825
Top Component Center:
  circle w0.05: c0,0 r0.35
  lines w0.05: -0.5,0 0.5,0 ; 0,-0.5 0,0.5
Top Assembly:
  text ".Designator" at -0.403,-0.203 h0.75
3D body "T_Rohm_BD4142HFV-TR.step": height 0.6, standoff 0, extent -0.8,-0.823 0.8,0.823